# Altium footprint library Connectors SMD.PcbLib: 130 footprints (part 11 of 12)
Each footprint in its own frame and in the unit in brackets; x right, y up, seen from the top. Pads: shape width x height; smd on the part's side, far side on the other; paste and mask are expansions set on the pad; w line width, h text height; cw(c..) or ccw(c..) is an arc to the next point about the centre after c.
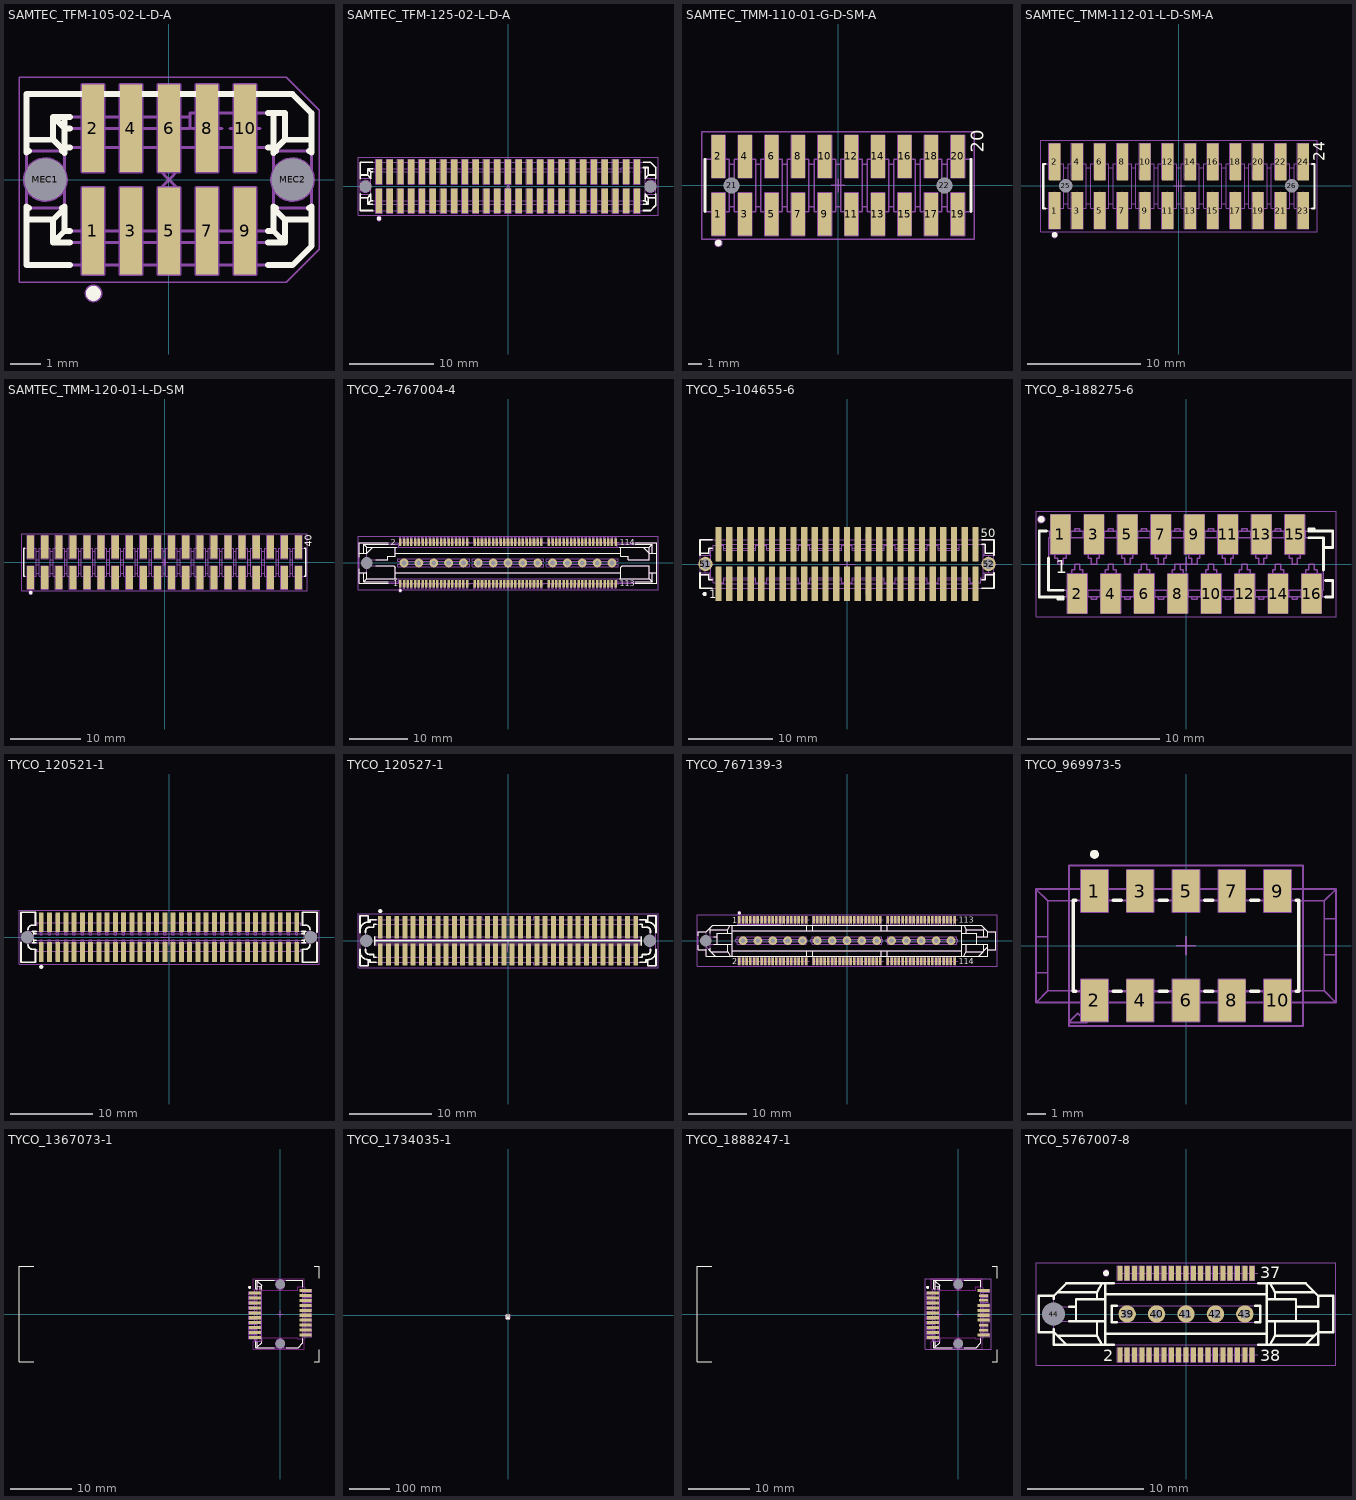
[diagram p10: the footprints below, top view; thin cyan lines are the x and y axes]

## SAMTEC_TFM-105-02-L-D-A [mm] "10 Contacts - Pitch 1.27mm - Dual Row Straight SMT Header"
height 5.72
pads (12):
  rect 0.74x2.92 smd: 1(-2.54,-1.715) 2(-2.54,1.715) 3(-1.27,-1.715) 4(-1.27,1.715) 5(0,-1.715) 6(0,1.715) 7(1.27,-1.715) 8(1.27,1.715) 9(2.54,-1.715) 10(2.54,1.715)
  round 1 hole 1.4 unplated mask+0.2: MEC1(-4.13,0) MEC2(4.13,0)
Top Overlay:
  circle w0.25: c-2.525,-3.8 r0.125
  circle w0.25: c-2.525,-3.8 r0.125
  lines w0.2: -4.762,-1.333 -3.873,-1.333 ; -4.762,-0.953 -4.68,-0.953 ; -4.762,-0.9 -4.762,-2.858 -3.31,-2.858 ; -4.762,0.9 -4.762,2.858 4.128,2.858 4.763,2.222 4.763,0.9 ; -4.762,0.953 -4.68,0.953 ; -4.762,1.333 -3.873,1.333 ; -3.58,-0.953 -3.492,-0.953 -3.873,-1.333 ; -3.58,0.953 -3.492,0.953 -3.873,1.333 ; -3.492,-0.896 -3.492,-1.714 ; -3.492,0.896 -3.492,2.095 ; -3.492,1.079 -3.31,1.079 ; -3.31,-2.095 -3.873,-2.095 ; -3.31,-1.714 -3.492,-1.714 ; -3.31,1.714 -3.492,1.714 -3.873,2.095 ; -3.31,2.095 -3.873,2.095 ; 3.31,-2.858 4.128,-2.858 4.763,-2.222 4.763,-0.9 ; 3.31,-2.095 3.874,-2.095 ; 3.31,-1.714 3.493,-1.714 ; 3.31,1.079 3.493,1.079 ; 3.31,2.222 3.874,2.222 3.874,1.333 ; 3.493,-0.896 3.493,-1.714 ; 3.493,0.896 3.493,2.222 ; 3.58,-0.953 3.493,-0.953 3.874,-1.333 ; 3.58,0.953 3.493,0.953 3.874,1.333 ; 4.68,-0.953 4.763,-0.953 ; 4.68,0.953 4.763,0.953 ; 4.763,-1.333 3.874,-1.333 ; 4.763,1.333 3.874,1.333 ; -3.873,-2.095 -3.492,-1.714 ; -3.873,-2.095 -3.873,-1.333 ; -3.873,1.333 -3.873,2.095 ; 3.493,-1.714 3.874,-2.095 ; 3.874,-2.095 3.874,-1.333
Mechanical 8:
  circle w0.1: c4.13,0 r0.7
  circle w0.1: c-4.13,0 r0.7
  lines w0.1: -4.63,0 -4.13,0 ; -4.13,-0.5 -4.13,0 ; -4.13,0.5 -4.13,0 ; -3.63,0 -4.13,0 ; -3.04,-1.715 -2.54,-1.715 ; -3.04,1.715 -2.54,1.715 ; -2.54,-2.215 -2.54,-1.715 ; -2.54,-1.215 -2.54,-1.715 ; -2.54,1.215 -2.54,1.715 ; -2.54,2.215 -2.54,1.715 ; -2.04,-1.715 -2.54,-1.715 ; -2.04,1.715 -2.54,1.715 ; -1.77,-1.715 -1.27,-1.715 ; -1.77,1.715 -1.27,1.715 ; -1.27,-2.215 -1.27,-1.715 ; -1.27,-1.215 -1.27,-1.715 ; -1.27,1.215 -1.27,1.715 ; -1.27,2.215 -1.27,1.715 ; -0.77,-1.715 -1.27,-1.715 ; -0.77,1.715 -1.27,1.715 ; -0.5,-1.715 0,-1.715 ; -0.5,1.715 0,1.715 ; -0.354,-0.354 0,0 ; -0.354,0.354 0,0 ; 0,-2.215 0,-1.715 ; 0,-1.215 0,-1.715 ; 0,1.215 0,1.715 ; 0,2.215 0,1.715 ; 0.354,-0.354 0,0 ; 0.354,0.354 0,0 ; 0.5,-1.715 0,-1.715 ; 0.5,1.715 0,1.715 ; 0.77,-1.715 1.27,-1.715 ; 0.77,1.715 1.27,1.715 ; 1.27,-2.215 1.27,-1.715 ; 1.27,-1.215 1.27,-1.715 ; 1.27,1.215 1.27,1.715 ; 1.27,2.215 1.27,1.715 ; 1.77,-1.715 1.27,-1.715 ; 1.77,1.715 1.27,1.715 ; 2.04,-1.715 2.54,-1.715 ; 2.04,1.715 2.54,1.715 ; 2.54,-2.215 2.54,-1.715 ; 2.54,-1.215 2.54,-1.715 ; 2.54,1.215 2.54,1.715 ; 2.54,2.215 2.54,1.715 ; 3.04,-1.715 2.54,-1.715 ; 3.04,1.715 2.54,1.715 ; 3.63,0 4.13,0 ; 4.13,-0.5 4.13,0 ; 4.13,0.5 4.13,0 ; 4.63,0 4.13,0 ; -2.91,-3.175 -2.91,-0.255 -2.17,-0.255 -2.17,-3.175 -2.91,-3.175 ; -2.91,0.255 -2.91,3.175 -2.17,3.175 -2.17,0.255 -2.91,0.255 ; -1.64,-3.175 -1.64,-0.255 -0.9,-0.255 -0.9,-3.175 -1.64,-3.175 ; -1.64,0.255 -1.64,3.175 -0.9,3.175 -0.9,0.255 -1.64,0.255 ; -0.37,-3.175 -0.37,-0.255 0.37,-0.255 0.37,-3.175 -0.37,-3.175 ; -0.37,0.255 -0.37,3.175 0.37,3.175 0.37,0.255 -0.37,0.255 ; 0.9,-3.175 0.9,-0.255 1.64,-0.255 1.64,-3.175 0.9,-3.175 ; 0.9,0.255 0.9,3.175 1.64,3.175 1.64,0.255 0.9,0.255 ; 2.17,-3.175 2.17,-0.255 2.91,-0.255 2.91,-3.175 2.17,-3.175 ; 2.17,0.255 2.17,3.175 2.91,3.175 2.91,0.255 2.17,0.255
Mechanical 14:
  circle w0.1: c-2.523,-3.8 r0.25
  lines w0.1: -4.762,-1.333 -3.873,-1.333 ; -4.762,-0.953 -3.492,-0.953 -3.873,-1.333 ; -4.762,0.953 -3.492,0.953 -3.873,1.333 ; -4.762,1.333 -3.873,1.333 ; -3.492,1.079 3.493,1.079 ; -3.492,2.095 -3.492,-1.714 ; 0.699,2.095 -3.873,2.095 ; 3.493,2.222 3.493,-1.714 ; 4.763,-1.333 3.874,-1.333 ; 4.763,-0.953 3.493,-0.953 3.874,-1.333 ; 4.763,0.953 3.493,0.953 3.874,1.333 ; 4.763,1.333 3.874,1.333 ; -3.873,-2.095 -3.492,-1.714 ; -3.873,-2.095 -3.873,-1.333 ; -3.873,-2.095 3.874,-2.095 ; -3.873,1.333 -3.873,2.095 ; -3.873,2.095 -3.492,1.714 0.699,1.714 0.699,2.222 3.874,2.222 3.874,1.333 ; -3.492,-1.714 3.493,-1.714 ; 3.493,-1.714 3.874,-2.095 ; 3.874,-2.095 3.874,-1.333 ; -4.762,-2.858 4.128,-2.858 4.763,-2.222 4.763,2.222 4.128,2.858 -4.762,2.858 -4.762,-2.858
Mechanical 15:
  lines w0.05: -5.012,-3.425 3.914,-3.425 5.013,-2.326 5.013,2.326 3.914,3.425 -5.012,3.425 -5.012,-3.425
3D body: height 5.59, standoff -1.14, extent -4.765,-2.984 4.765,2.985

## SAMTEC_TFM-125-02-L-D-A [mm] "50 Contacts - Pitch 1.27mm - Dual Row Straight SMT Header"
height 5.72
pads (52):
  rect 0.74x2.92 smd: 1(-15.24,-1.715) 2(-15.24,1.715) 3(-13.97,-1.715) 4(-13.97,1.715) 5(-12.7,-1.715) 6(-12.7,1.715) 7(-11.43,-1.715) 8(-11.43,1.715) 9(-10.16,-1.715) 10(-10.16,1.715) 11(-8.89,-1.715) 12(-8.89,1.715) 13(-7.62,-1.715) 14(-7.62,1.715) 15(-6.35,-1.715) 16(-6.35,1.715) 17(-5.08,-1.715) 18(-5.08,1.715) 19(-3.81,-1.715) 20(-3.81,1.715) 21(-2.54,-1.715) 22(-2.54,1.715) 23(-1.27,-1.715) 24(-1.27,1.715) 25(0,-1.715) 26(0,1.715) 27(1.27,-1.715) 28(1.27,1.715) 29(2.54,-1.715) 30(2.54,1.715) 31(3.81,-1.715) 32(3.81,1.715) 33(5.08,-1.715) 34(5.08,1.715) 35(6.35,-1.715) 36(6.35,1.715) 37(7.62,-1.715) 38(7.62,1.715) 39(8.89,-1.715) 40(8.89,1.715) 41(10.16,-1.715) 42(10.16,1.715) 43(11.43,-1.715) 44(11.43,1.715) 45(12.7,-1.715) 46(12.7,1.715) 47(13.97,-1.715) 48(13.97,1.715) 49(15.24,-1.715) 50(15.24,1.715)
  round 1 hole 1.4 unplated mask+0.2: MEC1(-16.83,0) MEC2(16.83,0)
Top Overlay:
  circle w0.25: c-15.225,-3.8 r0.125
  circle w0.25: c-15.225,-3.8 r0.125
  lines w0.2: -17.463,-1.333 -16.574,-1.333 ; -17.463,-0.953 -17.38,-0.953 ; -17.463,-0.9 -17.463,-2.858 -16.01,-2.858 ; -17.463,0.9 -17.463,2.858 -16.01,2.858 ; -17.463,0.953 -17.38,0.953 ; -17.463,1.333 -16.574,1.333 ; -16.28,-0.953 -16.193,-0.953 -16.574,-1.333 ; -16.28,0.953 -16.193,0.953 -16.574,1.333 ; -16.193,-0.896 -16.193,-1.714 ; -16.193,0.896 -16.193,1.714 ; -16.01,-2.095 -16.574,-2.095 ; -16.01,-1.714 -16.193,-1.714 ; -16.01,1.714 -16.193,1.714 ; -16.01,2.095 -16.574,2.095 ; 16.01,-2.858 16.828,-2.858 17.463,-2.222 17.463,-0.9 ; 16.01,-2.095 16.574,-2.095 ; 16.01,-1.714 16.193,-1.714 ; 16.01,2.222 16.574,2.222 16.574,1.333 ; 16.01,2.858 16.828,2.858 17.463,2.222 17.463,0.9 ; 16.193,-0.896 16.193,-1.714 ; 16.193,0.896 16.193,2.222 ; 16.28,-0.953 16.193,-0.953 16.574,-1.333 ; 16.28,0.953 16.193,0.953 16.574,1.333 ; 17.38,-0.953 17.463,-0.953 ; 17.38,0.953 17.463,0.953 ; 17.463,-1.333 16.574,-1.333 ; 17.463,1.333 16.574,1.333 ; -16.574,-2.095 -16.193,-1.714 ; -16.574,-2.095 -16.574,-1.333 ; -16.574,1.333 -16.574,2.095 ; -16.574,2.095 -16.193,1.714 ; 16.193,-1.714 16.574,-2.095 ; 16.574,-2.095 16.574,-1.333
Mechanical 8:
  drawing of 426 lines, arcs and shapes, not listed
Mechanical 14:
  circle w0.1: c-15.223,-3.8 r0.25
  lines w0.1: -17.463,-1.333 -16.574,-1.333 ; -17.463,-0.953 -16.193,-0.953 -16.574,-1.333 ; -17.463,0.953 -16.193,0.953 -16.574,1.333 ; -17.463,1.333 -16.574,1.333 ; 13.399,2.095 -16.574,2.095 ; 16.193,2.222 16.193,-1.714 ; 17.463,-1.333 16.574,-1.333 ; 17.463,-0.953 16.193,-0.953 16.574,-1.333 ; 17.463,0.953 16.193,0.953 16.574,1.333 ; 17.463,1.333 16.574,1.333 ; -16.574,-2.095 16.574,-2.095 ; -16.574,-2.095 -16.193,-1.714 ; -16.574,-2.095 -16.574,-1.333 ; -16.574,1.333 -16.574,2.095 ; -16.574,2.095 -16.193,1.714 ; -16.193,-1.714 -16.193,1.714 ; -16.193,-1.714 16.193,-1.714 ; -16.193,1.714 13.399,1.714 13.399,2.222 16.574,2.222 16.574,1.333 ; 16.193,-1.714 16.574,-2.095 ; 16.574,-2.095 16.574,-1.333 ; -17.463,-2.858 16.828,-2.858 17.463,-2.222 17.463,2.222 16.828,2.858 -17.463,2.858 -17.463,-2.858
Mechanical 15:
  lines w0.05: -17.713,-3.425 -17.713,3.425 17.713,3.425 17.713,-3.425 -17.713,-3.425
3D body: height 5.59, standoff -1.14, extent -17.465,-2.984 17.465,2.985

## SAMTEC_TMM-110-01-G-D-SM-A [mm] "20 Contacts - Pitch 2mm - Dual Row Surface Mount Straight Strip Header With Alignment Pin"
height 5.97
pads (22):
  rect 1.02x3.215 smd: 1(-9,-2.178) 2(-9,2.178) 3(-7,-2.178) 4(-7,2.178) 5(-5,-2.178) 6(-5,2.178) 7(-3,-2.178) 8(-3,2.178) 9(-1,-2.178) 10(-1,2.178) 11(1,-2.178) 12(1,2.178) 13(3,-2.178) 14(3,2.178) 15(5,-2.178) 16(5,2.178) 17(7,-2.178) 18(7,2.178) 19(9,-2.178) 20(9,2.178)
  round 1 hole 1.2 unplated: 21(-8,0) 22(8,0)
Top Overlay:
  circle w0.25: c-8.998,-4.327 r0.125
  circle w0.25: c-8.998,-4.327 r0.125
  lines w0.2: -10,-1.969 -10,1.969 ; 10,-1.969 10,1.969
  text "20" at 10.95,2.453 h1
Mechanical 8:
  drawing of 172 lines, arcs and shapes, not listed
Mechanical 14:
  drawing of 379 lines, arcs and shapes, not listed
  text "20" at 10.95,2.453 h1
Mechanical 15:
  lines w0.1: -10.25,-4.035 -10.25,4.035 10.25,4.035 10.25,-4.035 -10.25,-4.035
3D body: height 5.97, standoff -1.02, extent -10,-3.274 10,3.274

## SAMTEC_TMM-112-01-L-D-SM-A [mm] "24 Contacts - Pitch 2mm - Top Entry, Dual Row Surface Mount Header"
height 5.97
pads (26):
  rect 1x3.3 smd: 1(-11,-2.178) 2(-11,2.123) 3(-9,-2.178) 4(-9,2.123) 5(-7,-2.178) 6(-7,2.123) 7(-5,-2.178) 8(-5,2.123) 9(-3,-2.178) 10(-3,2.123) 11(-1,-2.178) 12(-1,2.123) 13(1,-2.178) 14(1,2.123) 15(3,-2.178) 16(3,2.123) 17(5,-2.178) 18(5,2.123) 19(7,-2.178) 20(7,2.123) 21(9,-2.178) 22(9,2.123) 23(11,-2.178) 24(11,2.123)
  round 1 hole 1.2 unplated: 25(-10,0) 26(10,0)
Top Overlay:
  circle w0.25: c-10.998,-4.327 r0.125
  circle w0.25: c-10.998,-4.327 r0.125
  lines w0.2: -11.8,-1.996 -12,-1.996 -12,1.941 -11.8,1.941 ; 11.8,-1.996 12,-1.996 12,1.941 11.8,1.941
  text "24" at 12.9,2.173 h1
Mechanical 8:
  drawing of 300 lines, arcs and shapes, not listed
Mechanical 14:
  drawing of 455 lines, arcs and shapes, not listed
  text "24" at 12.9,2.173 h1
Mechanical 15:
  lines w0.1: -12.25,-4.035 -12.25,4.035 12.25,4.035 12.25,-4.035 -12.25,-4.035
3D body: height 5.97, standoff -1.02, extent -12,-3.274 12,3.274

## SAMTEC_TMM-120-01-L-D-SM [mm] "40 Contacts - Pitch 2mm - Top Entry, Dual Row Surface Mount Header"
height 5.97
pads (40):
  rect 1x3.3 smd: 1(-19,-2.15) 2(-19,2.15) 3(-17,-2.15) 4(-17,2.15) 5(-15,-2.15) 6(-15,2.15) 7(-13,-2.15) 8(-13,2.15) 9(-11,-2.15) 10(-11,2.15) 11(-9,-2.15) 12(-9,2.15) 13(-7,-2.15) 14(-7,2.15) 15(-5,-2.15) 16(-5,2.15) 17(-3,-2.15) 18(-3,2.15) 19(-1,-2.15) 20(-1,2.15) 21(1,-2.15) 22(1,2.15) 23(3,-2.15) 24(3,2.15) 25(5,-2.15) 26(5,2.15) 27(7,-2.15) 28(7,2.15) 29(9,-2.15) 30(9,2.15) 31(11,-2.15) 32(11,2.15) 33(13,-2.15) 34(13,2.15) 35(15,-2.15) 36(15,2.15) 37(17,-2.15) 38(17,2.15) 39(19,-2.15) 40(19,2.15)
Top Overlay:
  circle w0.25: c-18.998,-4.3 r0.125
  circle w0.25: c-18.998,-4.3 r0.125
  lines w0.2: -19.8,-1.969 -20,-1.969 -20,1.969 -19.8,1.969 ; 19.8,-1.969 20,-1.969 20,1.969 19.8,1.969
  text "40" at 20.9,2.2 h1
Mechanical 8:
  drawing of 324 lines, arcs and shapes, not listed
Mechanical 14:
  drawing of 637 lines, arcs and shapes, not listed
  text "40" at 20.9,2.2 h1
Mechanical 15:
  lines w0.1: -20.25,-4.05 20.25,-4.05 20.25,4.05 -20.25,4.05 -20.25,-4.05
3D body: height 5.97, standoff 0, extent -20,-3.275 20,3.275

## TYCO_2-767004-4 [mm] "114 Positions, Pitch 25 [0.64], Centerline Matched Impedance Vertical Receptacle (MICTOR)"
height 6.35
pads (130):
  rect 0.43x1.27 smd: 1(-18.415,-3.531) 2(-18.415,3.531) 3(-17.78,-3.531) 4(-17.78,3.531) 5(-17.145,-3.531) 6(-17.145,3.531) 7(-16.51,-3.531) 8(-16.51,3.531) 9(-15.875,-3.531) 10(-15.875,3.531) 11(-15.24,-3.531) 12(-15.24,3.531) 13(-14.605,-3.531) 14(-14.605,3.531) 15(-13.97,-3.531) 16(-13.97,3.531) 17(-13.335,-3.531) 18(-13.335,3.531) 19(-12.7,-3.531) 20(-12.7,3.531) 21(-12.065,-3.531) 22(-12.065,3.531) 23(-11.43,-3.531) 24(-11.43,3.531) 25(-10.795,-3.531) 26(-10.795,3.531) 27(-10.16,-3.531) 28(-10.16,3.531) 29(-9.525,-3.531) 30(-9.525,3.531) 31(-8.89,-3.531) 32(-8.89,3.531) 33(-8.255,-3.531) 34(-8.255,3.531) 35(-7.62,-3.531) 36(-7.62,3.531) 37(-6.985,-3.531) 38(-6.985,3.531) 39(-5.715,-3.531) 40(-5.715,3.531) 41(-5.08,-3.531) 42(-5.08,3.531) 43(-4.445,-3.531) 44(-4.445,3.531) 45(-3.81,-3.531) 46(-3.81,3.531) 47(-3.175,-3.531) 48(-3.175,3.531) 49(-2.54,-3.531) 50(-2.54,3.531) 51(-1.905,-3.531) 52(-1.905,3.531) 53(-1.27,-3.531) 54(-1.27,3.531) 55(-0.635,-3.531) 56(-0.635,3.531) 57(0,-3.531) 58(0,3.531) 59(0.635,-3.531) 60(0.635,3.531) 61(1.27,-3.531) 62(1.27,3.531) 63(1.905,-3.531) 64(1.905,3.531) 65(2.54,-3.531) 66(2.54,3.531) 67(3.175,-3.531) 68(3.175,3.531) 69(3.81,-3.531) 70(3.81,3.531) 71(4.445,-3.531) 72(4.445,3.531) 73(5.08,-3.531) 74(5.08,3.531) 75(5.715,-3.531) 76(5.715,3.531) 77(6.985,-3.531) 78(6.985,3.531) 79(7.62,-3.531) 80(7.62,3.531) 81(8.255,-3.531) 82(8.255,3.531) 83(8.89,-3.531) 84(8.89,3.531) 85(9.525,-3.531) 86(9.525,3.531) 87(10.16,-3.531) 88(10.16,3.531) 89(10.795,-3.531) 90(10.795,3.531) 91(11.43,-3.531) 92(11.43,3.531) 93(12.065,-3.531) 94(12.065,3.531) 95(12.7,-3.531) 96(12.7,3.531) 97(13.335,-3.531) 98(13.335,3.531) 99(13.97,-3.531) 100(13.97,3.531) 101(14.605,-3.531) 102(14.605,3.531) 103(15.24,-3.531) 104(15.24,3.531) 105(15.875,-3.531) 106(15.875,3.531) 107(16.51,-3.531) 108(16.51,3.531) 109(17.145,-3.531) 110(17.145,3.531) 111(17.78,-3.531) 112(17.78,3.531) 113(18.415,-3.531) 114(18.415,3.531)
  round 1.5 hole 0.8: 115(17.78,0) 116(15.24,0) 117(12.7,0) 118(10.16,0) 119(7.62,0) 120(5.08,0) 121(2.54,0) 122(0,0) 123(-2.54,0) 124(-5.08,0) 125(-7.62,0) 126(-10.16,0) 127(-12.7,0) 128(-15.24,0) 129(-17.78,0)
  round 1 hole 2 unplated: 130(-24.13,0)
Top Overlay:
  circle w0.25: c-18.415,-4.716 r0.125
  lines w0.2: -25.4,-1.676 -24.13,-1.676 ; -25.4,-0.973 -25.4,-3.454 -20.5,-3.454 ; -25.4,0.973 -25.4,3.454 -20.5,3.454 ; -25.4,1.676 -24.13,1.676 -23.114,2.692 ; -24.638,-1.676 -24.638,-3.2 ; -24.638,1.676 -24.638,3.2 ; -24.13,-1.6 -24.13,-2.692 ; -24.13,1.6 -24.13,2.692 ; -22.613,-0.508 -19.507,-0.508 -19.253,-0.762 -19.253,-2.692 ; -22.613,0.508 -20.523,0.508 -20.523,1.143 -19.253,1.143 -19.253,2.692 ; -20.5,-3.2 -24.638,-3.2 ; -20.5,3.2 -24.638,3.2 ; -19.253,-1.676 19.253,-1.676 ; -19.253,1.676 19.253,1.676 ; -19.03,-2.692 -24.13,-2.692 ; -19.03,2.692 -24.13,2.692 ; 19.03,-2.692 24.13,-2.692 ; 19.03,2.692 24.13,2.692 ; 19.253,-2.692 19.253,-0.762 19.507,-0.508 24.13,-0.508 24.13,-2.692 ; 19.253,2.692 19.253,1.143 20.523,1.143 20.523,0.508 24.13,0.508 24.13,2.692 ; 21.8,-3.454 25.4,-3.454 25.4,3.454 21.8,3.454 ; 21.8,-3.2 24.638,-3.2 ; 21.8,3.2 24.638,3.2 ; 23.114,2.692 24.13,1.676 25.4,1.676 ; 24.13,-1.676 25.4,-1.676 ; 24.638,-1.676 24.638,-3.2 ; 24.638,1.676 24.638,3.2 ; -24.638,-3.2 -24.13,-2.692 ; -24.638,3.2 -24.13,2.692 ; 24.13,-2.692 24.638,-3.2 ; 24.13,2.692 24.638,3.2
  text "1" at -19.6,-4.025 h1
  text "2" at -20.05,3.05 h1
  text "113" at 19.1,-4.025 h1
  text "114" at 19.075,3.05 h1
Mechanical 8:
  drawing of 406 lines, arcs and shapes, not listed
Mechanical 14:
  drawing of 415 lines, arcs and shapes, not listed
Mechanical 15:
  lines w0.05: -25.65,-4.606 25.65,-4.606 25.65,4.606 -25.65,4.606 -25.65,-4.606
3D body: height 6.1, standoff -1.3, extent -25.4,-4.356 25.4,4.356

## TYCO_5-104655-6 [mm] "2x25 Position, 1.27mm Pitch, Surface Mount, AMPMODU Male Connector"
height 5.78
pads (52):
  rect 0.75x4.1 smd: 1(-15.24,-2.33) 2(-15.24,2.33) 3(-13.97,-2.33) 4(-13.97,2.33) 5(-12.7,-2.33) 6(-12.7,2.33) 7(-11.43,-2.33) 8(-11.43,2.33) 9(-10.16,-2.33) 10(-10.16,2.33) 11(-8.89,-2.33) 12(-8.89,2.33) 13(-7.62,-2.33) 14(-7.62,2.33) 15(-6.35,-2.33) 16(-6.35,2.33) 17(-5.08,-2.33) 18(-5.08,2.33) 19(-3.81,-2.33) 20(-3.81,2.33) 21(-2.54,-2.33) 22(-2.54,2.33) 23(-1.27,-2.33) 24(-1.27,2.33) 25(0,-2.33) 26(0,2.33) 27(1.27,-2.33) 28(1.27,2.33) 29(2.54,-2.33) 30(2.54,2.33) 31(3.81,-2.33) 32(3.81,2.33) 33(5.08,-2.33) 34(5.08,2.33) 35(6.35,-2.33) 36(6.35,2.33) 37(7.62,-2.33) 38(7.62,2.33) 39(8.89,-2.33) 40(8.89,2.33) 41(10.16,-2.33) 42(10.16,2.33) 43(11.43,-2.33) 44(11.43,2.33) 45(12.7,-2.33) 46(12.7,2.33) 47(13.97,-2.33) 48(13.97,2.33) 49(15.24,-2.33) 50(15.24,2.33)
  round 1.7 hole 1.2 unplated: 51(-16.79,0) 52(16.79,0)
Top Overlay:
  circle w0.25: c-16.889,-3.556 r0.125
  lines w0.2: -17.424,-1.27 -16.408,-1.27 -16.408,-1.867 -16.015,-1.867 ; -17.424,-1.077 -17.424,-2.858 -16.015,-2.858 ; -17.424,1.077 -17.424,2.858 -16.015,2.858 ; -17.424,1.27 -16.408,1.27 -16.408,1.867 -16.015,1.867 ; 16.015,-2.858 17.424,-2.858 17.424,-1.077 ; 16.015,-1.867 16.408,-1.867 16.408,-1.27 17.424,-1.27 ; 16.015,2.324 16.408,2.324 16.408,1.27 17.424,1.27 ; 16.015,2.858 17.424,2.858 17.424,1.077
  text "1" at -16.328,-4.081 h1
  text "50" at 15.868,3.168 h1
Mechanical 8:
  lines w0.1: -17.79,0 -16.79,0 ; -16.79,-1 -16.79,0 ; -16.79,1 -16.79,0 ; -15.79,0 -16.79,0 ; -15.24,-3.33 -15.24,-2.33 ; -15.24,-1.33 -15.24,-2.33 ; -15.24,1.33 -15.24,2.33 ; -15.24,3.33 -15.24,2.33 ; -13.97,-3.33 -13.97,-2.33 -13.97,-1.33 ; -13.97,1.33 -13.97,2.33 -13.97,3.33 ; -12.7,-3.33 -12.7,-2.33 -12.7,-1.33 ; -12.7,1.33 -12.7,2.33 -12.7,3.33 ; -11.43,-3.33 -11.43,-2.33 -11.43,-1.33 ; -11.43,1.33 -11.43,2.33 -11.43,3.33 ; -10.16,-3.33 -10.16,-2.33 -10.16,-1.33 ; -10.16,1.33 -10.16,2.33 -10.16,3.33 ; -8.89,-3.33 -8.89,-2.33 -8.89,-1.33 ; -8.89,1.33 -8.89,2.33 -8.89,3.33 ; -7.62,-3.33 -7.62,-2.33 -7.62,-1.33 ; -7.62,1.33 -7.62,2.33 -7.62,3.33 ; -6.35,-3.33 -6.35,-2.33 -6.35,-1.33 ; -6.35,1.33 -6.35,2.33 -6.35,3.33 ; -5.08,-3.33 -5.08,-2.33 -5.08,-1.33 ; -5.08,1.33 -5.08,2.33 -5.08,3.33 ; -3.81,-3.33 -3.81,-2.33 -3.81,-1.33 ; -3.81,1.33 -3.81,2.33 -3.81,3.33 ; -2.54,-3.33 -2.54,-2.33 -2.54,-1.33 ; -2.54,1.33 -2.54,2.33 -2.54,3.33 ; -1.27,-3.33 -1.27,-2.33 -1.27,-1.33 ; -1.27,1.33 -1.27,2.33 -1.27,3.33 ; -1,0 0,0 ; 0,-3.33 0,-2.33 0,-1.33 ; 0,-1 0,0 ; 0,1 0,0 ; 0,1.33 0,2.33 0,3.33 ; 1,0 0,0 ; 1.27,-3.33 1.27,-2.33 1.27,-1.33 ; 1.27,1.33 1.27,2.33 1.27,3.33 ; 2.54,-3.33 2.54,-2.33 2.54,-1.33 ; 2.54,1.33 2.54,2.33 2.54,3.33 ; 3.81,-3.33 3.81,-2.33 3.81,-1.33 ; 3.81,1.33 3.81,2.33 3.81,3.33 ; 5.08,-3.33 5.08,-2.33 5.08,-1.33 ; 5.08,1.33 5.08,2.33 5.08,3.33 ; 6.35,-3.33 6.35,-2.33 6.35,-1.33 ; 6.35,1.33 6.35,2.33 6.35,3.33 ; 7.62,-3.33 7.62,-2.33 7.62,-1.33 ; 7.62,1.33 7.62,2.33 7.62,3.33 ; 8.89,-3.33 8.89,-2.33 8.89,-1.33 ; 8.89,1.33 8.89,2.33 8.89,3.33 ; 10.16,-3.33 10.16,-2.33 10.16,-1.33 ; 10.16,1.33 10.16,2.33 10.16,3.33 ; 11.43,-3.33 11.43,-2.33 11.43,-1.33 ; 11.43,1.33 11.43,2.33 11.43,3.33 ; 12.7,-3.33 12.7,-2.33 12.7,-1.33 ; 12.7,1.33 12.7,2.33 12.7,3.33 ; 13.97,-3.33 13.97,-2.33 13.97,-1.33 ; 13.97,1.33 13.97,2.33 13.97,3.33 ; 15.24,-3.33 15.24,-2.33 ; 15.24,-1.33 15.24,-2.33 ; 15.24,1.33 15.24,2.33 ; 15.24,3.33 15.24,2.33 ; 15.79,0 16.79,0 ; 16.79,-1 16.79,0 ; 16.79,1 16.79,0 ; 17.79,0 16.79,0 ; -15.24,-2.33 15.24,-2.33 ; -15.24,2.33 15.24,2.33
Mechanical 14:
  drawing of 297 lines, arcs and shapes, not listed
  text "1" at -16.328,-4.081 h1
  text "50" at 15.868,3.168 h1
3D body: height 5.8, standoff -1.2, extent -17.405,-3.619 17.444,3.62

## TYCO_8-188275-6 [mm] "16 contacts, 1.27mm Centerline, Micro-MaTch Surface Mount, Board-Board & Ribbon-Board Female Connectors"
height 5.3
pads (16):
  rect 1.5x3 smd: 1(-9.525,2.25) 2(-8.255,-2.25) 3(-6.985,2.25) 4(-5.715,-2.25) 5(-4.445,2.25) 6(-3.175,-2.25) 7(-1.905,2.25) 8(-0.635,-2.25) 9(0.635,2.25) 10(1.905,-2.25) 11(3.175,2.25) 12(4.445,-2.25) 13(5.715,2.25) 14(6.985,-2.25) 15(8.255,2.25) 16(9.525,-2.25)
Top Overlay:
  circle w0.25: c-10.975,3.385 r0.125
  lines w0.2: -10.575,2.5 -11.125,2.5 -11.125,-2.5 -9.305,-2.5 ; -10.425,0.45 -10.425,-2 -9.305,-2 ; -9.725,-2.5 -9.725,-2.67 -9.325,-2.67 -9.325,-2.5 ; 9.305,2 10.425,2 10.425,-0.45 10.425,1.25 11.125,1.25 11.125,2.5 9.305,2.5 ; 9.325,2.5 9.325,2.67 9.725,2.67 9.725,2.5 ; 10.575,-2.5 11.125,-2.5 11.125,-1.25 10.575,-1.25
  text "1" at -9.875,-0.701 h1
Mechanical 8:
  drawing of 200 lines, arcs and shapes, not listed
Mechanical 14:
  drawing of 333 lines, arcs and shapes, not listed
  text "1" at -9.875,-0.701 h1
Mechanical 15:
  lines w0.025: -11.375,-4 -11.375,4 11.375,4 11.375,-4 -11.375,-4
3D body: height 5.25, standoff 0, extent -11.125,-3.45 11.125,3.456
